# Altium footprint library PcbLib1.PcbLib: 44 footprints (part 3 of 3)
Each footprint in its own frame and in the unit in brackets; x right, y up, seen from the top. Pads: shape width x height; smd on the part's side, far side on the other; paste and mask are expansions set on the pad; w line width, h text height; cw(c..) or ccw(c..) is an arc to the next point about the centre after c.
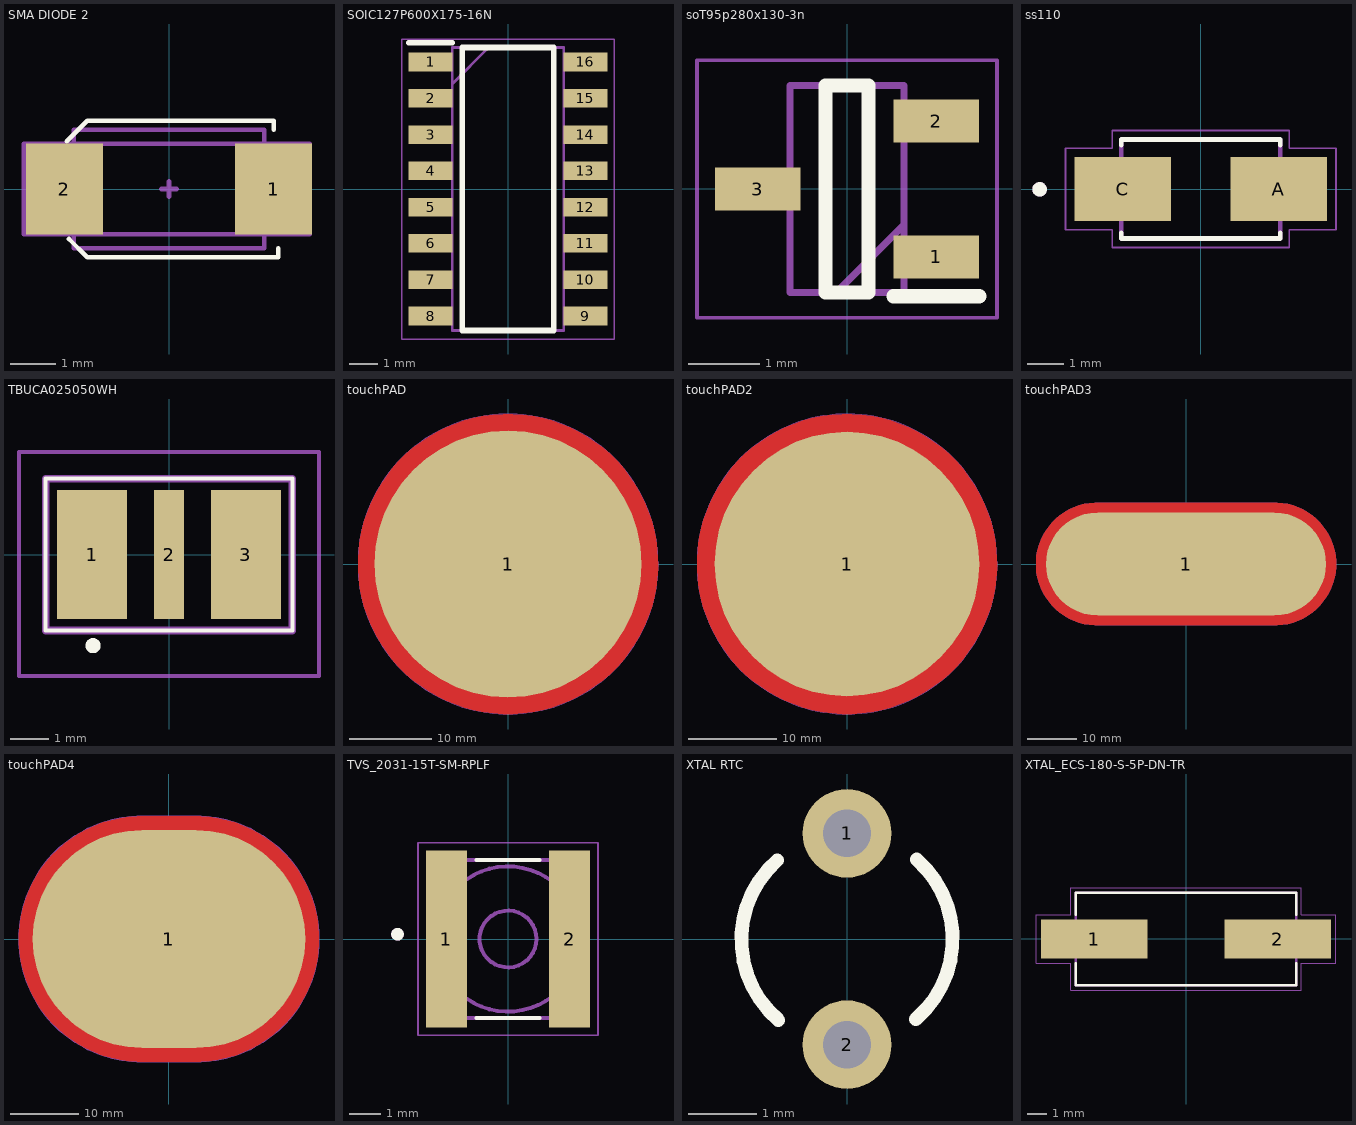
[diagram p2: the footprints below, top view; thin cyan lines are the x and y axes]

## SMA DIODE 2 [mm]
pads (2):
  rect 1.7x2 smd: 1(2.3,0) 2(-2.3,0)
Top Overlay:
  lines w0.1: -2.25,1.05 -1.8,1.5 2.3,1.5 2.3,1.3 ; -2.2,-1.1 -1.8,-1.5 2.4,-1.5 2.4,-1.3
Mechanical 13:
  lines w0.1: -2.1,-1.3 -2.1,1.3 2.1,1.3 2.1,-1.3 -2.1,-1.3
Mechanical 15:
  lines w0.1: -0.175,0 0.175,0 ; 0,-0.175 0,0.175 ; -3.2,-1 -3.2,1 3.1,1 3.1,-1 -3.2,-1
3D body: height 0.55, standoff 0, extent -2.1,-1.3 2.1,1.3

## SOIC127P600X175-16N [mm]
pads (16):
  rect 1.525x0.65 smd: 1(-2.712,4.445) 2(-2.712,3.175) 3(-2.712,1.905) 4(-2.712,0.635) 5(-2.712,-0.635) 6(-2.712,-1.905) 7(-2.712,-3.175) 8(-2.712,-4.445) 9(2.712,-4.445) 10(2.712,-3.175) 11(2.712,-1.905) 12(2.712,-0.635) 13(2.712,0.635) 14(2.712,1.905) 15(2.712,3.175) 16(2.712,4.445)
Top Overlay:
  lines w0.2: -3.475,5.12 -1.95,5.12 ; -1.6,-4.95 -1.6,4.95 1.6,4.95 1.6,-4.95 -1.6,-4.95
Mechanical 13:
  lines w0.1: -1.95,3.68 -0.68,4.95 ; -1.95,-4.95 -1.95,4.95 1.95,4.95 1.95,-4.95 -1.95,-4.95
Mechanical 15:
  lines w0.05: -3.725,-5.25 -3.725,5.25 3.725,5.25 3.725,-5.25 -3.725,-5.25
3D body "MAX3232ECD.stp": height 1.75, standoff 0, extent -3.013,-4.94 3.013,4.96

## soT95p280x130-3n [mm]
pads (3):
  rect 1.2x0.6 smd: 1(1.25,-0.95) 2(1.25,0.95) 3(-1.25,0)
Top Overlay:
  lines w0.2: 0.65,-1.5 1.85,-1.5 ; -0.3,-1.45 -0.3,1.45 0.3,1.45 0.3,-1.45 -0.3,-1.45
Mechanical 13:
  lines w0.1: -0.15,-1.45 0.8,-0.5 ; -0.8,-1.45 0.8,-1.45 0.8,1.45 -0.8,1.45 -0.8,-1.45
Mechanical 15:
  lines w0.05: -2.1,-1.8 2.1,-1.8 2.1,1.8 -2.1,1.8 -2.1,-1.8
3D body "TS78L05CX_RFG.stp": height 1.3, standoff 0, extent -1.4,-1.503 1.4,1.397

## ss110 [mm]
pads (2):
  rect 2.65x1.75 smd: A(2.15,0) C(-2.15,0)
Top Overlay:
  circle w0.2: c-4.44,-0.01 r0.1
  lines w0.127: -2.187,-1.2 -2.187,-1.362 2.188,-1.362 2.188,-1.2 ; -2.187,1.2 -2.187,1.362 2.188,1.362 2.188,1.2
Mechanical 13:
  circle w0.2: c-4.44,-0.01 r0.1
  lines w0.127: -2.187,-1.362 2.188,-1.362 2.188,1.362 -2.187,1.362 -2.187,-1.362
Mechanical 15:
  lines w0.05: -3.725,-1.125 -2.438,-1.125 -2.438,-1.613 2.438,-1.613 2.438,-1.125 3.725,-1.125 3.725,1.125 2.438,1.125 2.438,1.613 -2.438,1.613 -2.438,1.125 -3.725,1.125 -3.725,-1.125
3D body "Diode SS14.SLDPRT": height 2.25, standoff 0, extent -2.5,-1.362 2.5,1.338

## TBUCA025050WH [mm]
pads (3):
  rect 1.85x3.4 smd: 1(-2.025,0) 3(2.025,0)
  rect 0.8x3.4 smd: 2(0,0)
Top Overlay:
  lines w0.1: -3.25,-2 3.25,-2 3.25,2 -3.25,2 -3.25,-2
  lines w0.2: -2,-2.5 ccw(c-2,-2.4) -2,-2.3 ccw(c-2,-2.4) -2,-2.5
Mechanical 13:
  lines w0.2: -3.25,-2 3.25,-2 3.25,2 -3.25,2 -3.25,-2
Mechanical 15:
  lines w0.1: -3.95,-3.2 3.95,-3.2 3.95,2.7 -3.95,2.7 -3.95,-3.2
3D body "TBU-CA065-200-WH.stp": height 0.88, standoff 0, extent -3.25,-2 3.25,2

## touchPAD [mm]
pads (1):
  round 32.5 smd mask+0.102: 1(0,0)
Top Layer:
  pour cut-out: 0,-18.25 -0.597,-18.25 -1.79,-18.172 -2.974,-18.016 -4.146,-17.783 -5.301,-17.474 -6.432,-17.089 -7.536,-16.632 -8.608,-16.104 -9.642,-15.506 -10.636,-14.842 -11.584,-14.115 -12.482,-13.327 -13.327,-12.482 -14.115,-11.584 -14.842,-10.636 -15.506,-9.642 -16.104,-8.608 -16.632,-7.536 -17.089,-6.432 -17.474,-5.301 -17.783,-4.146 -18.016,-2.974 -18.172,-1.79 -18.25,-0.597 -18.25,0 -18.25,0.597 -18.172,1.79 -18.016,2.974 -17.783,4.146 -17.474,5.301 -17.089,6.432 -16.632,7.536 -16.104,8.608 -15.506,9.642 -14.842,10.636 -14.115,11.584 -13.327,12.482 -12.482,13.327 -11.584,14.115 -10.636,14.842 -9.642,15.506 -8.608,16.104 -7.536,16.632 -6.432,17.089 -5.301,17.474 -4.146,17.783 -2.974,18.016 -1.79,18.172 -0.597,18.25 0,18.25 0.597,18.25 1.79,18.172 2.974,18.016 4.146,17.783 5.301,17.474 6.432,17.089 7.536,16.632 8.608,16.104 9.642,15.506 10.636,14.842 11.584,14.115 12.482,13.327 13.327,12.482 14.115,11.584 14.842,10.636 15.506,9.642 16.104,8.608 16.632,7.536 17.089,6.432 17.474,5.301 17.783,4.146 18.016,2.974 18.172,1.79 18.25,0.597 18.25,0 18.25,-0.597 18.172,-1.79 18.016,-2.974 17.783,-4.146 17.474,-5.301 17.089,-6.432 16.632,-7.536 16.104,-8.608 15.506,-9.642 14.842,-10.636 14.115,-11.584 13.327,-12.482 12.482,-13.327 11.584,-14.115 10.636,-14.842 9.642,-15.506 8.608,-16.104 7.536,-16.632 6.432,-17.089 5.301,-17.474 4.146,-17.783 2.974,-18.016 1.79,-18.172 0.597,-18.25
Bottom Layer:
  pour cut-out: 0,-18.25 -0.597,-18.25 -1.79,-18.172 -2.974,-18.016 -4.146,-17.783 -5.301,-17.474 -6.432,-17.089 -7.536,-16.632 -8.608,-16.104 -9.642,-15.506 -10.636,-14.842 -11.584,-14.115 -12.482,-13.327 -13.327,-12.482 -14.115,-11.584 -14.842,-10.636 -15.506,-9.642 -16.104,-8.608 -16.632,-7.536 -17.089,-6.432 -17.474,-5.301 -17.783,-4.146 -18.016,-2.974 -18.172,-1.79 -18.25,-0.597 -18.25,0 -18.25,0.597 -18.172,1.79 -18.016,2.974 -17.783,4.146 -17.474,5.301 -17.089,6.432 -16.632,7.536 -16.104,8.608 -15.506,9.642 -14.842,10.636 -14.115,11.584 -13.327,12.482 -12.482,13.327 -11.584,14.115 -10.636,14.842 -9.642,15.506 -8.608,16.104 -7.536,16.632 -6.432,17.089 -5.301,17.474 -4.146,17.783 -2.974,18.016 -1.79,18.172 -0.597,18.25 0,18.25 0.597,18.25 1.79,18.172 2.974,18.016 4.146,17.783 5.301,17.474 6.432,17.089 7.536,16.632 8.608,16.104 9.642,15.506 10.636,14.842 11.584,14.115 12.482,13.327 13.327,12.482 14.115,11.584 14.842,10.636 15.506,9.642 16.104,8.608 16.632,7.536 17.089,6.432 17.474,5.301 17.783,4.146 18.016,2.974 18.172,1.79 18.25,0.597 18.25,0 18.25,-0.597 18.172,-1.79 18.016,-2.974 17.783,-4.146 17.474,-5.301 17.089,-6.432 16.632,-7.536 16.104,-8.608 15.506,-9.642 14.842,-10.636 14.115,-11.584 13.327,-12.482 12.482,-13.327 11.584,-14.115 10.636,-14.842 9.642,-15.506 8.608,-16.104 7.536,-16.632 6.432,-17.089 5.301,-17.474 4.146,-17.783 2.974,-18.016 1.79,-18.172 0.597,-18.25
Top Courtyard:
  circle w0.1: c0,0 r16.25
  circle w0.1: c0,0 r18.25

## touchPAD2 [mm]
pads (1):
  round 30 smd mask+0.102: 1(0,0)
Top Layer:
  pour cut-out: 0,-17 -0.557,-17 -1.667,-16.927 -2.771,-16.782 -3.862,-16.565 -4.937,-16.277 -5.991,-15.919 -7.02,-15.493 -8.018,-15.001 -8.982,-14.444 -9.907,-13.826 -10.79,-13.148 -11.627,-12.414 -12.414,-11.627 -13.148,-10.79 -13.826,-9.907 -14.444,-8.982 -15.001,-8.018 -15.493,-7.02 -15.919,-5.991 -16.277,-4.937 -16.565,-3.862 -16.782,-2.771 -16.927,-1.667 -17,-0.557 -17,0 -17,0.557 -16.927,1.667 -16.782,2.771 -16.565,3.862 -16.277,4.937 -15.919,5.991 -15.493,7.02 -15.001,8.018 -14.444,8.982 -13.826,9.907 -13.148,10.79 -12.414,11.627 -11.627,12.414 -10.79,13.148 -9.907,13.826 -8.982,14.444 -8.018,15.001 -7.02,15.493 -5.991,15.919 -4.937,16.277 -3.862,16.565 -2.771,16.782 -1.667,16.927 -0.557,17 0,17 0.557,17 1.667,16.927 2.771,16.782 3.862,16.565 4.937,16.277 5.991,15.919 7.02,15.493 8.018,15.001 8.982,14.444 9.907,13.826 10.79,13.148 11.627,12.414 12.414,11.627 13.148,10.79 13.826,9.907 14.444,8.982 15.001,8.018 15.493,7.02 15.919,5.991 16.277,4.937 16.565,3.862 16.782,2.771 16.927,1.667 17,0.557 17,0 17,-0.557 16.927,-1.667 16.782,-2.771 16.565,-3.862 16.277,-4.937 15.919,-5.991 15.493,-7.02 15.001,-8.018 14.444,-8.982 13.826,-9.907 13.148,-10.79 12.414,-11.627 11.627,-12.414 10.79,-13.148 9.907,-13.826 8.982,-14.444 8.018,-15.001 7.02,-15.493 5.991,-15.919 4.937,-16.277 3.862,-16.565 2.771,-16.782 1.667,-16.927 0.557,-17
Bottom Layer:
  pour cut-out: 0,-17 -0.557,-17 -1.667,-16.927 -2.771,-16.782 -3.862,-16.565 -4.937,-16.277 -5.991,-15.919 -7.02,-15.493 -8.018,-15.001 -8.982,-14.444 -9.907,-13.826 -10.79,-13.148 -11.627,-12.414 -12.414,-11.627 -13.148,-10.79 -13.826,-9.907 -14.444,-8.982 -15.001,-8.018 -15.493,-7.02 -15.919,-5.991 -16.277,-4.937 -16.565,-3.862 -16.782,-2.771 -16.927,-1.667 -17,-0.557 -17,0 -17,0.557 -16.927,1.667 -16.782,2.771 -16.565,3.862 -16.277,4.937 -15.919,5.991 -15.493,7.02 -15.001,8.018 -14.444,8.982 -13.826,9.907 -13.148,10.79 -12.414,11.627 -11.627,12.414 -10.79,13.148 -9.907,13.826 -8.982,14.444 -8.018,15.001 -7.02,15.493 -5.991,15.919 -4.937,16.277 -3.862,16.565 -2.771,16.782 -1.667,16.927 -0.557,17 0,17 0.557,17 1.667,16.927 2.771,16.782 3.862,16.565 4.937,16.277 5.991,15.919 7.02,15.493 8.018,15.001 8.982,14.444 9.907,13.826 10.79,13.148 11.627,12.414 12.414,11.627 13.148,10.79 13.826,9.907 14.444,8.982 15.001,8.018 15.493,7.02 15.919,5.991 16.277,4.937 16.565,3.862 16.782,2.771 16.927,1.667 17,0.557 17,0 17,-0.557 16.927,-1.667 16.782,-2.771 16.565,-3.862 16.277,-4.937 15.919,-5.991 15.493,-7.02 15.001,-8.018 14.444,-8.982 13.826,-9.907 13.148,-10.79 12.414,-11.627 11.627,-12.414 10.79,-13.148 9.907,-13.826 8.982,-14.444 8.018,-15.001 7.02,-15.493 5.991,-15.919 4.937,-16.277 3.862,-16.565 2.771,-16.782 1.667,-16.927 0.557,-17
Top Courtyard:
  circle w0.1: c0,0 r17

## touchPAD3 [mm]
pads (1):
  oval 57x21 smd mask+0.102: 1(0,0)
Top Layer:
  pour cut-out: -18.034,-12.5 18.034,-12.5 18.58,-12.5 19.667,-12.405 20.742,-12.215 21.796,-11.933 22.822,-11.559 23.811,-11.098 24.757,-10.552 25.651,-9.926 26.487,-9.225 27.259,-8.453 27.96,-7.617 28.586,-6.723 29.132,-5.777 29.593,-4.788 29.967,-3.762 30.249,-2.708 30.439,-1.633 30.534,-0.546 30.534,0.546 30.439,1.633 30.249,2.708 29.967,3.762 29.593,4.788 29.132,5.777 28.586,6.723 27.96,7.617 27.259,8.453 26.487,9.225 25.651,9.926 24.757,10.552 23.811,11.098 22.822,11.559 21.796,11.933 20.742,12.215 19.667,12.405 18.58,12.5 18.034,12.5 -18.034,12.5 -18.58,12.5 -19.667,12.405 -20.742,12.215 -21.796,11.933 -22.822,11.559 -23.811,11.098 -24.757,10.552 -25.651,9.926 -26.487,9.225 -27.259,8.453 -27.96,7.617 -28.586,6.723 -29.132,5.777 -29.593,4.788 -29.967,3.762 -30.249,2.708 -30.439,1.633 -30.534,0.546 -30.534,-0.546 -30.439,-1.633 -30.249,-2.708 -29.967,-3.762 -29.593,-4.788 -29.132,-5.777 -28.586,-6.723 -27.96,-7.617 -27.259,-8.453 -26.487,-9.225 -25.651,-9.926 -24.757,-10.552 -23.811,-11.098 -22.822,-11.559 -21.796,-11.933 -20.742,-12.215 -19.667,-12.405 -18.58,-12.5
Bottom Layer:
  pour cut-out: -18.034,-12.5 18.034,-12.5 18.58,-12.5 19.667,-12.405 20.742,-12.215 21.796,-11.933 22.822,-11.559 23.811,-11.098 24.757,-10.552 25.651,-9.926 26.487,-9.225 27.259,-8.453 27.96,-7.617 28.586,-6.723 29.132,-5.777 29.593,-4.788 29.967,-3.762 30.249,-2.708 30.439,-1.633 30.534,-0.546 30.534,0.546 30.439,1.633 30.249,2.708 29.967,3.762 29.593,4.788 29.132,5.777 28.586,6.723 27.96,7.617 27.259,8.453 26.487,9.225 25.651,9.926 24.757,10.552 23.811,11.098 22.822,11.559 21.796,11.933 20.742,12.215 19.667,12.405 18.58,12.5 18.034,12.5 -18.034,12.5 -18.58,12.5 -19.667,12.405 -20.742,12.215 -21.796,11.933 -22.822,11.559 -23.811,11.098 -24.757,10.552 -25.651,9.926 -26.487,9.225 -27.259,8.453 -27.96,7.617 -28.586,6.723 -29.132,5.777 -29.593,4.788 -29.967,3.762 -30.249,2.708 -30.439,1.633 -30.534,0.546 -30.534,-0.546 -30.439,-1.633 -30.249,-2.708 -29.967,-3.762 -29.593,-4.788 -29.132,-5.777 -28.586,-6.723 -27.96,-7.617 -27.259,-8.453 -26.487,-9.225 -25.651,-9.926 -24.757,-10.552 -23.811,-11.098 -22.822,-11.559 -21.796,-11.933 -20.742,-12.215 -19.667,-12.405 -18.58,-12.5
Top Courtyard:
  lines w0.3: -18.034,-10.5 cw(c-18.034,0) -18.034,10.5 18.034,10.5 cw(c18.034,0) 18.034,-10.5 -18.034,-10.5

## touchPAD4 [mm]
pads (1):
  oval 40x32 smd mask+0.102: 1(0,0)
Top Layer:
  pour cut-out: -4,-18 4.001,-18 4.644,-18 5.926,-17.908 7.199,-17.725 8.455,-17.452 9.689,-17.09 10.894,-16.64 12.063,-16.106 13.192,-15.49 14.273,-14.795 15.303,-14.024 16.274,-13.183 17.183,-12.273 18.025,-11.302 18.796,-10.272 19.491,-9.191 20.107,-8.062 20.641,-6.893 21.091,-5.688 21.453,-4.454 21.726,-3.198 21.909,-1.925 22.001,-0.643 22.001,0.643 21.909,1.925 21.726,3.198 21.453,4.454 21.091,5.688 20.641,6.893 20.107,8.062 19.491,9.191 18.796,10.272 18.025,11.302 17.183,12.273 16.274,13.182 15.303,14.024 14.273,14.795 13.192,15.49 12.063,16.106 10.894,16.64 9.689,17.09 8.455,17.452 7.199,17.725 5.926,17.908 4.644,18 4.001,18 -4,18 -4.643,18 -5.925,17.908 -7.198,17.725 -8.454,17.452 -9.688,17.09 -10.893,16.64 -12.062,16.106 -13.191,15.49 -14.272,14.795 -15.302,14.024 -16.273,13.182 -17.182,12.273 -18.024,11.302 -18.795,10.272 -19.49,9.191 -20.106,8.062 -20.64,6.893 -21.09,5.688 -21.452,4.454 -21.725,3.198 -21.908,1.925 -22,0.643 -22,-0.643 -21.908,-1.925 -21.725,-3.198 -21.452,-4.454 -21.09,-5.688 -20.64,-6.893 -20.106,-8.062 -19.49,-9.191 -18.795,-10.272 -18.024,-11.302 -17.182,-12.273 -16.273,-13.183 -15.302,-14.024 -14.272,-14.795 -13.191,-15.49 -12.062,-16.106 -10.893,-16.64 -9.688,-17.09 -8.454,-17.452 -7.198,-17.725 -5.925,-17.908 -4.643,-18
Bottom Layer:
  pour cut-out: -4,-18 4.001,-18 4.644,-18 5.926,-17.908 7.199,-17.725 8.455,-17.452 9.689,-17.09 10.894,-16.64 12.063,-16.106 13.192,-15.49 14.273,-14.795 15.303,-14.024 16.274,-13.183 17.183,-12.273 18.025,-11.302 18.796,-10.272 19.491,-9.191 20.107,-8.062 20.641,-6.893 21.091,-5.688 21.453,-4.454 21.726,-3.198 21.909,-1.925 22.001,-0.643 22.001,0.643 21.909,1.925 21.726,3.198 21.453,4.454 21.091,5.688 20.641,6.893 20.107,8.062 19.491,9.191 18.796,10.272 18.025,11.302 17.183,12.273 16.274,13.182 15.303,14.024 14.273,14.795 13.192,15.49 12.063,16.106 10.894,16.64 9.689,17.09 8.455,17.452 7.199,17.725 5.926,17.908 4.644,18 4.001,18 -4,18 -4.643,18 -5.925,17.908 -7.198,17.725 -8.454,17.452 -9.688,17.09 -10.893,16.64 -12.062,16.106 -13.191,15.49 -14.272,14.795 -15.302,14.024 -16.273,13.182 -17.182,12.273 -18.024,11.302 -18.795,10.272 -19.49,9.191 -20.106,8.062 -20.64,6.893 -21.09,5.688 -21.452,4.454 -21.725,3.198 -21.908,1.925 -22,0.643 -22,-0.643 -21.908,-1.925 -21.725,-3.198 -21.452,-4.454 -21.09,-5.688 -20.64,-6.893 -20.106,-8.062 -19.49,-9.191 -18.795,-10.272 -18.024,-11.302 -17.182,-12.273 -16.273,-13.183 -15.302,-14.024 -14.272,-14.795 -13.191,-15.49 -12.062,-16.106 -10.893,-16.64 -9.688,-17.09 -8.454,-17.452 -7.198,-17.725 -5.925,-17.908 -4.643,-18
Top Courtyard:
  lines w0.2: -4,-18 cw(c-4,0) -4,18 4.001,18 cw(c4.001,0) 4.001,-18 -4,-18

## TVS_2031-15T-SM-RPLF [mm]
pads (2):
  rect 1.3x5.6 smd: 1(-1.95,0) 2(1.95,0)
Top Overlay:
  circle w0.2: c-3.5,0.15 r0.1
  lines w0.127: -1,-2.5 1,-2.5 ; -1,2.5 1,2.5
Mechanical 13:
  circle w0.127: c0,0 r2.3
  circle w0.127: c0,0 r0.9
  circle w0.2: c-3.5,0.15 r0.1
  lines w0.127: -2.5,-2 -2,-2.5 2,-2.5 2.5,-2 2.5,2 2,2.5 -2,2.5 -2.5,2 -2.5,-2
Mechanical 15:
  lines w0.05: -2.85,-3.05 2.85,-3.05 2.85,3.05 -2.85,3.05 -2.85,-3.05

## XTAL RTC [mm]
pads (2):
  round 1.3 hole 0.7: 1(0,1.55) 2(0,-1.55)
Top Overlay:
  lines w0.2: -1.022,1.155 ccw(c0,-0.01) -1.006,-1.189 ; 1.006,-1.179 ccw(c0,0) 1.022,1.165
3D body "Crystal TH.STEP": height 8.98, standoff -1.8, extent -1.6,-1.725 1.6,1.725

## XTAL_ECS-180-S-5P-DN-TR [mm]
pads (2):
  rect 5.5x2 smd: 1(-4.75,0) 2(4.75,0)
Top Overlay:
  lines w0.127: -5.7,-1.254 -5.7,-2.4 5.7,-2.4 5.7,-1.254 ; -5.7,1.254 -5.7,2.4 5.7,2.4 5.7,1.254
Mechanical 13:
  lines w0.127: -5.7,-2.4 -5.7,2.4 5.7,2.4 5.7,-2.4 -5.7,-2.4
Mechanical 15:
  lines w0.05: -7.75,-1.25 -5.95,-1.25 -5.95,-2.65 5.95,-2.65 5.95,-1.25 7.75,-1.25 7.75,1.25 5.95,1.25 5.95,2.65 -5.95,2.65 -5.95,1.25 -7.75,1.25 -7.75,-1.25
3D body "ECS-180-S-5P-DN-TR.STEP": height 4.3, standoff 0, extent -6.6,-2.39 6.6,2.41